# Altium footprint library Library 3D.PcbLib: 288 footprints (part 15 of 18)
Each footprint in its own frame and in the unit in brackets; x right, y up, seen from the top. Pads: shape width x height; smd on the part's side, far side on the other; paste and mask are expansions set on the pad; w line width, h text height; cw(c..) or ccw(c..) is an arc to the next point about the centre after c.
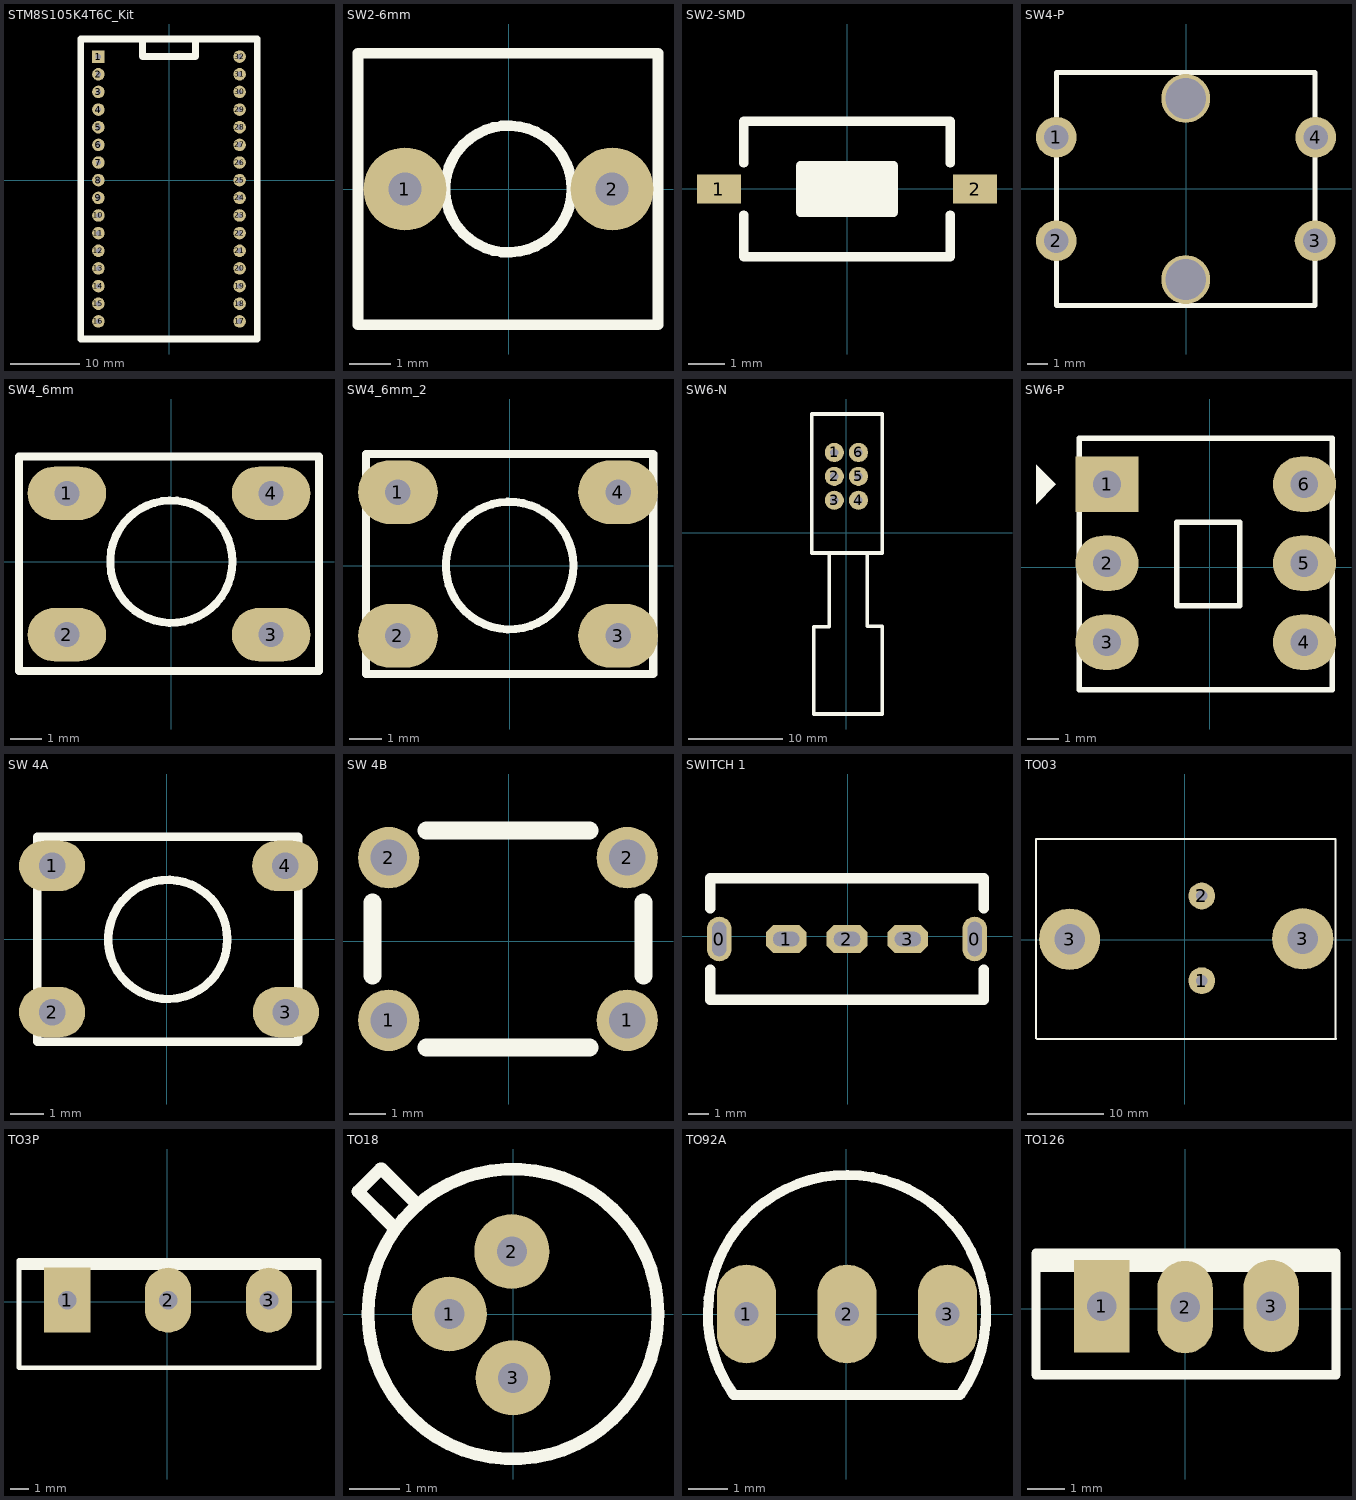
[diagram p14: the footprints below, top view; thin cyan lines are the x and y axes]

## STM8S105K4T6C_Kit [mm]
pads (32):
  rect 1.8x1.8 hole 0.8: 1(-10.16,17.78)
  round 1.8 hole 0.762: 2(-10.16,15.24) 3(-10.16,12.7) 4(-10.16,10.16) 5(-10.16,7.62) 6(-10.16,5.08) 7(-10.16,2.54) 8(-10.16,0) 9(-10.16,-2.54) 10(-10.16,-5.08) 11(-10.16,-7.62) 12(-10.16,-10.16) 13(-10.16,-12.7) 14(-10.16,-15.24) 15(-10.16,-17.78) 16(-10.16,-20.32) 17(10.16,-20.32) 18(10.16,-17.78) 19(10.16,-15.24) 20(10.16,-12.7) 21(10.16,-10.16) 22(10.16,-7.62) 23(10.16,-5.08) 24(10.16,-2.54) 25(10.16,0) 26(10.16,2.54) 27(10.16,5.08) 28(10.16,7.62) 29(10.16,10.16) 30(10.16,12.7) 31(10.16,15.24) 32(10.16,17.78)
Top Overlay:
  lines w1: -3.81,20.32 -3.81,17.78 3.81,17.78 3.81,20.32 ; -12.7,-22.86 -12.7,20.32 12.7,20.32 12.7,-22.86 -12.7,-22.86

## SW2-6mm [mm]
pads (2):
  round 2 hole 0.8: 1(-2.5,0) 2(2.5,0)
Top Overlay:
  circle w0.254: c0,0 r1.53
  lines w0.254: -3.632,-3.277 -3.632,3.277 3.607,3.277 3.607,-3.277 -3.632,-3.277
3D body "SW2-6mm.STEP": height 4.5, standoff -12.25, extent -3.1,-3.1 3.1,3.1

## SW2-SMD [mm]
pads (2):
  rect 1.2x0.8 smd: 1(-3.5,0) 2(3.5,0)
Top Overlay:
  rectangle: -1.27,-0.635 1.27,0.635
  lines w0.254: -2.819,-0.711 -2.819,-1.854 2.819,-1.854 2.819,-0.711 ; -2.819,0.711 -2.819,1.854 2.819,1.854 2.819,0.711 ; -1.27,-0.635 -1.27,0.635 1.27,0.635 1.27,-0.635 -1.27,-0.635
3D body "User Library-Button-SMD.step": height 2.5, standoff 0, extent -3.05,-1.85 3.05,1.85

## SW4-P [mm]
pads (6):
  round 2 hole 1.2: 1(-6.375,2.54) 2(-6.375,-2.54) 3(6.325,-2.54) 4(6.35,2.54)
  round 2.4 hole 2: ""(-0.025,-4.445) ""(-0.025,4.445)
Top Overlay:
  lines w0.254: -6.375,-5.715 6.325,-5.715 6.325,5.715 -6.375,5.715 -6.375,-5.715
3D body "User Library-Button-BIG-4.step": height 9.5, standoff -3.5, extent -6.936,-6 6.937,6

## SW4_6mm [mm]
pads (4):
  oval 2.5x1.7 hole 0.8: 1(-3.325,2.175) 2(-3.325,-2.325) 3(3.175,-2.325) 4(3.175,2.175)
Top Overlay:
  circle w0.254: c0,0 r1.947
  lines w0.254: -4.85,-3.475 -4.85,3.35 4.7,3.35 4.7,-3.475 -4.85,-3.475
3D body "SW4.STEP": height 3.5, standoff -4, extent -3.5,-3.075 3.3,2.925

## SW4_6mm_2 [mm]
pads (4):
  oval 2.5x2 hole 0.8: 1(-3.5,2.3) 2(-3.5,-2.2) 3(3.4,-2.2) 4(3.4,2.3)
Top Overlay:
  circle w0.254: c0,0 r2
  lines w0.254: -4.5,-3.4 4.5,-3.4 4.5,3.5 -4.5,3.5 -4.5,-3.4
3D body "User Library-tactile BUTTON.STEP": height 4.85, standoff -2.5, extent -3.95,-3.1 3.95,3.1

## SW6-N [mil]
pads (6):
  round 80 hole 35: 1(-50.12,335.35) 2(-50.12,235.35) 3(-50.12,135.35) 4(50.88,135.35) 5(50.88,235.35) 6(50.88,335.35)
Top Overlay:
  lines w15: -71.12,-85.65 -71.12,-394.65 -137.12,-394.65 -137.12,-759.65 150.88,-759.65 150.88,-392.65 86.88,-392.65 86.88,-85.65 91.88,-85.65 ; -145.12,-85.65 149.88,-85.65 149.88,496.35 -145.12,496.35 -145.12,-85.65
3D body "User Library-DPDT Push Switch-1.STEP": height 394.31, standoff -156.88, extent -145.12,-761.3 150.16,496.91

## SW6-P [mil]
pads (6):
  rect 80x70 hole 35: 1(-129.91,104.95)
  oval 80x70 hole 35: 2(-129.91,4.95) 3(-129.91,-95.05) 4(120.09,-95.05) 5(120.09,4.95) 6(120.09,104.95)
Top Overlay:
  region: -219.91,129.95 -194.91,104.95 -219.91,79.95
  lines w7: -164.91,-155.05 -164.91,162.95 155.09,162.95 155.09,-155.05 -164.91,-155.05 ; -41.91,-49.05 -41.91,56.95 38.09,56.95 38.09,-49.05 -41.91,-49.05
3D body "User Library-PSM1-0-0.STEP": height 532.1, standoff -137.19, extent -163.39,-154.52 151.58,160.44

## SW 4A [mm]
pads (4):
  oval 2x1.53 hole 0.8: 1(-3.475,2.225) 2(-3.475,-2.2) 3(3.6,-2.2) 4(3.575,2.225)
Top Overlay:
  circle w0.254: c0.025,0 r1.803
  lines w0.254: -3.925,-3.1 3.975,-3.1 3.975,3.1 -3.925,3.1 -3.925,-3.1
3D body "SW3dPS-diptronics tactile dts-63k.STEP": height 3, standoff -7.5, extent -3.925,-3.1 3.975,3.1

## SW 4B [mm]
pads (4):
  round 1.7 hole 1: 1(-3.317,-2.183) 1(3.283,-2.183) 2(-3.317,2.317) 2(3.283,2.317)
Top Overlay:
  lines w0.508: -3.767,-0.933 -3.767,1.067 ; -2.267,-2.933 2.233,-2.933 ; -2.267,3.067 2.233,3.067 ; 3.733,-0.933 3.733,1.067
3D body "B3F-1060 - 6mm height.STEP": height 6, standoff -3.5, extent -3.645,-2.933 3.611,3.067

## SWITCH 1 [mm]
pads (5):
  oval 1.2x2.2 hole 0.7 slot 1.7 at 90 deg: 0(-6.335,-0.146) 0(6.265,-0.146)
  oct 2x1.4 hole 0.7 slot 1.3 at 0 deg: 1(-3.035,-0.146) 2(-0.035,-0.146) 3(2.965,-0.146)
Top Overlay:
  lines w0.508: -6.785,-1.646 -6.785,-3.146 6.715,-3.146 6.715,-1.646 ; -6.785,1.354 -6.785,2.854 6.715,2.854 6.715,1.354
3D body "Switch 2 channel_3 pins_type 2.STEP": height 6, standoff -3, extent -6.535,-8.996 6.465,2.604

## TO03 [mm]
pads (4):
  round 3.5 hole 1.5: 1(2.2,-5.325) 2(2.2,5.75)
  round 8 hole 4: 3(-15.075,0.1) 3(15.4,0.15)
Top Overlay:
  lines w0.254: 19.675,13.175 -19.475,13.175 -19.475,-12.825 -19.375,-12.925 19.75,-12.925 19.675,-12.85 19.675,13.175 ; 19.675,13.175 19.675,13.175
3D body "SW3dPS-2N3055_New.STEP": height 9.2, standoff -11.7, extent -19.475,-12.825 19.781,13.175

## TO3P [mm]
pads (3):
  rect 2.5x3.5 hole 1: 1(-5.4,0.1)
  oval 2.5x3.5 hole 1: 2(0.05,0.1) 3(5.5,0.1)
Top Overlay:
  lines w0.254: -8,1.85 8.15,1.85 ; -8,2.075 8.2,2.075 ; -8,-3.55 -8,2.25 8.2,2.25 8.2,-3.55 -8,-3.55
3D body "TO3P.STEP": height 26.46, standoff -13.44, extent -7.7,-3.25 7.9,1.55

## TO18 [mm]
pads (3):
  round 1.5 hole 0.6: 1(-1.275,0) 2(-0.025,1.25) 3(0,-1.275)
Top Overlay:
  circle w0.254: c0,0 r2.9
  lines w0.254: -2.375,1.725 -3.1,2.45 -2.65,2.9 ; -1.95,2.225 -2.625,2.9 -2.65,2.9 ; -2.65,2.9 -2.65,2.9
3D body "User Library-TO-18.STEP": height 5.3, standoff -4, extent -2.9,-2.9 2.9,2.9

## TO92A [mm]
pads (3):
  oval 1.5x2.5 hole 0.6: 1(-2.525,0) 2(0.015,0) 3(2.555,0)
Top Overlay:
  lines w0.254: -2.852,-2.033 cw(c0.015,0) 2.872,-2.048 ; -2.85,-2.05 2.875,-2.05
3D body "TO92.STEP": height 9.79, standoff -10.21, extent -2.73,-1.381 2.8,2.3

## TO126 [mm]
pads (3):
  rect 1.5x2.5 hole 0.8: 1(-2.25,0.075)
  oval 1.5x2.5 hole 0.8: 2(0,0.05) 3(2.325,0.075)
Top Overlay:
  rectangle: -4.025,1 4.075,1.5
  lines w0.254: -4.025,-1.775 4.075,-1.775 4.075,1.5 -4.025,1.5 -4.025,-1.775
3D body "User Library-BD135 (TO-126,SOT32) v4.STEP": height 14.6, standoff -3.35, extent -3.875,-1.625 3.925,1.075